# Altium footprint library 2.52-直插元件.PcbLib: 467 footprints (part 28 of 30)
Each footprint in its own frame and in the unit in brackets; x right, y up, seen from the top. Pads: shape width x height; smd on the part's side, far side on the other; paste and mask are expansions set on the pad; w line width, h text height; cw(c..) or ccw(c..) is an arc to the next point about the centre after c.
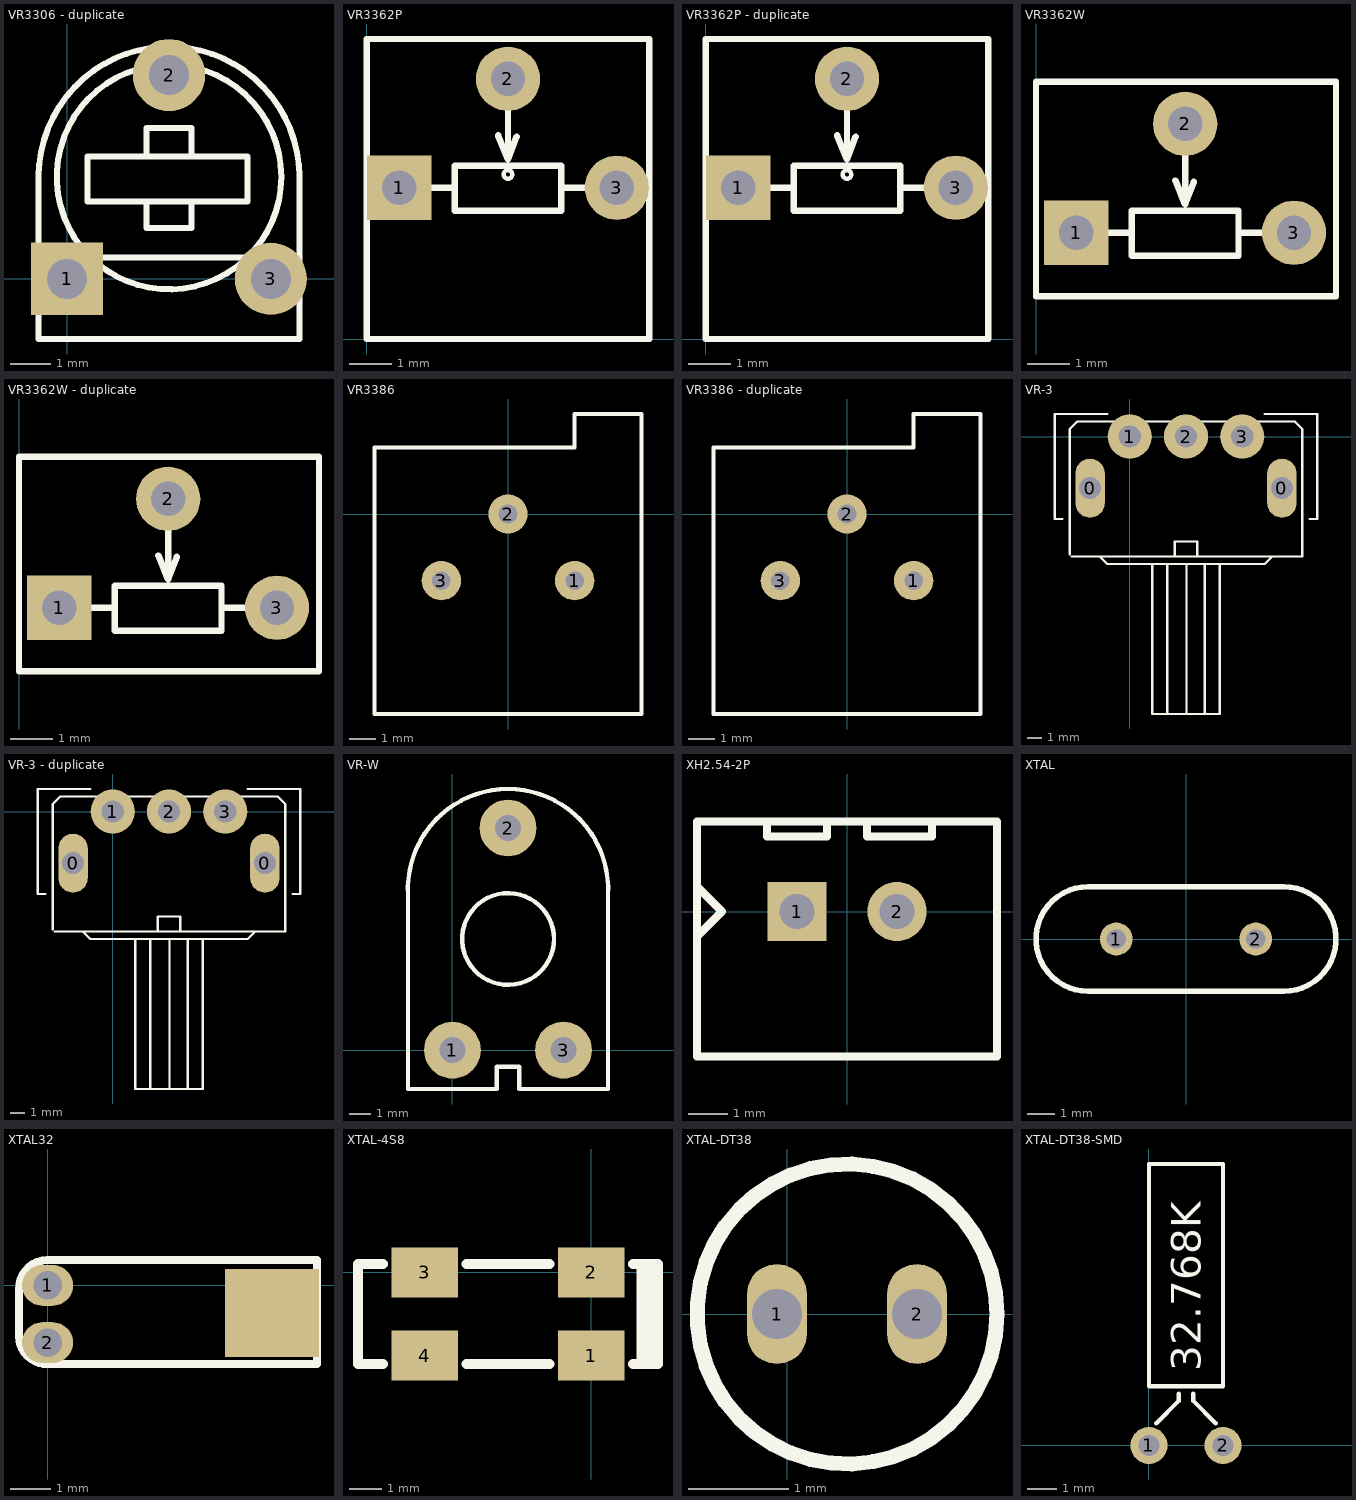
[diagram p27: the footprints below, top view; thin cyan lines are the x and y axes]

## VR3306 - duplicate [mm]
pads (3):
  rect 1.8x1.8 hole 1: 1(0,0)
  round 1.8 hole 1: 2(2.54,5.08) 3(5.08,0)
Top Overlay:
  circle w0.15: c2.54,2.54 r2.801
  lines w0.15: -0.711,-1.5 5.789,-1.5 5.789,2.539 ; -0.71,-1.499 -0.71,2.54 cw(c2.54,2.54) 5.79,2.54 ; 0.61,0.533 4.572,0.533 ; 1.981,1.93 1.981,1.27 3.099,1.27 3.099,1.93 ; 1.981,3.099 1.981,3.759 3.099,3.759 3.099,3.099 ; 0.508,1.93 4.496,1.93 4.496,3.048 0.508,3.048 0.508,1.93
3D body "User Library-Trimmer, 3306F-1.STEP": height 7.62, standoff -3.04, extent -0.865,-2.294 5.945,5.957
3D body "User Library-Trimpot Horizontal.step": height 4.2, standoff -5.6, extent 9.103,14.919 19.103,25.119
3D body "User Library-Trimpot Vertical.step": height 4.2, standoff -1.45, extent 9.327,-1.755 19.327,13.545

## VR3362P [mm]
pads (3):
  rect 1.5x1.5 hole 0.8: 1(0.76,3.53)
  round 1.5 hole 0.8: 2(3.3,6.07) 3(5.84,3.53)
Top Overlay:
  circle w0.1: c3.3,3.84 r0.1
  lines w0.15: 0.76,3.53 2.055,3.53 ; 3.071,4.749 3.3,4.19 ; 3.3,5.892 3.3,4.19 ; 3.503,4.724 3.3,4.19 ; 4.545,3.53 5.84,3.53 ; 2.055,3.53 2.055,4.038 4.545,4.038 4.545,2.997 2.055,2.997 2.055,3.53 ; 0,0 0,7 6.6,7 6.6,0 0,0
3D body "User Library-3362P-1-102LF.step": height 4.4, standoff -3, extent 0,0.2 6.6,6.8

## VR3362P - duplicate [mm] "淘宝ID:黄晶宝石   店铺网址:https://shop463601444.taobao.com"
pads (3):
  rect 1.5x1.5 hole 0.8: 1(0.76,3.53)
  round 1.5 hole 0.8: 2(3.3,6.07) 3(5.84,3.53)
Top Overlay:
  circle w0.1: c3.3,3.84 r0.1
  lines w0.15: 0.76,3.53 2.055,3.53 ; 3.071,4.749 3.3,4.19 ; 3.3,5.892 3.3,4.19 ; 3.503,4.724 3.3,4.19 ; 4.545,3.53 5.84,3.53 ; 2.055,3.53 2.055,2.997 4.545,2.997 4.545,4.038 2.055,4.038 2.055,3.53 ; 0,0 6.6,0 6.6,7 0,7 0,0
3D body "User Library-3362P-1-102LF.step": height 4.4, standoff -3, extent 0,0.2 6.6,6.8

## VR3362W [mm]
pads (3):
  rect 1.5x1.5 hole 0.8: 1(0.94,3.48)
  round 1.5 hole 0.8: 2(3.48,6.02) 3(6.02,3.48)
Top Overlay:
  lines w0.15: 0.94,3.48 2.235,3.48 ; 3.251,4.699 3.48,4.14 ; 3.48,5.842 3.48,4.14 ; 3.683,4.674 3.48,4.14 ; 4.724,3.48 6.02,3.48 ; 2.235,3.48 2.235,2.946 4.724,2.946 4.724,3.988 2.235,3.988 2.235,3.48 ; 0,2 0,7 7,7 7,2 0,2
3D body "User Library-3362W.step": height 6.99, standoff -1.5, extent 0.2,2.365 6.8,7.075

## VR3362W - duplicate [mm]
pads (3):
  rect 1.5x1.5 hole 0.8: 1(0.94,3.48)
  round 1.5 hole 0.8: 2(3.48,6.02) 3(6.02,3.48)
Top Overlay:
  lines w0.15: 0.94,3.48 2.235,3.48 ; 3.251,4.699 3.48,4.14 ; 3.48,5.842 3.48,4.14 ; 3.683,4.674 3.48,4.14 ; 4.724,3.48 6.02,3.48 ; 2.235,3.48 2.235,3.988 4.724,3.988 4.724,2.946 2.235,2.946 2.235,3.48 ; 0,2 7,2 7,7 0,7 0,2
3D body "User Library-3362W.step": height 6.99, standoff -1.5, extent 0.2,2.365 6.8,7.075

## VR3386 [mm]
pads (3):
  round 1.5 hole 0.711: 1(2.54,-2.54) 2(0,0) 3(-2.54,-2.54)
Top Overlay:
  lines w0.15: -5.08,-7.62 -5.08,2.54 2.54,2.54 2.54,3.81 5.08,3.81 5.08,-7.62 -5.08,-7.62
3D body "SW3dPS-3386P-S.STEP": height 5.02, standoff -1.99, extent -4.8,-7.34 4.8,2.26

## VR3386 - duplicate [mm]
pads (3):
  round 1.5 hole 0.711: 1(2.54,-2.54) 2(0,0) 3(-2.54,-2.54)
Top Overlay:
  lines w0.15: -5.08,-7.62 5.08,-7.62 5.08,3.81 2.54,3.81 2.54,2.54 -5.08,2.54 -5.08,-7.62
3D body "SW3dPS-3386P-S.STEP": height 5.02, standoff -1.99, extent -4.8,-7.34 4.8,2.26

## VR-3 [mm]
pads (5):
  oval 2x4 hole 1.5: 0(-2.69,-3.5) 0(10.31,-3.5)
  round 3 hole 1.5: 1(0,0) 2(3.81,0) 3(7.62,0)
Top Overlay:
  lines w0.15: -4.572,-5.588 -5.08,-5.588 -5.08,1.524 -2.54,1.524 ; -4.572,1.524 -1.524,1.524 ; -4.064,-8 -4.064,0.508 -3.556,1.016 11.176,1.016 11.684,0.508 11.684,-8.128 -3.936,-8.128 ; -2.032,-8.128 -1.524,-8.636 9.144,-8.636 9.652,-8.128 ; 1.524,-8.636 1.524,-18.796 6.096,-18.796 6.096,-8.636 ; 2.54,-18.796 2.54,-8.636 ; 3.048,-8.128 3.048,-7.112 4.572,-7.112 4.572,-8.128 ; 3.85,-18.796 3.85,-8.636 ; 5.08,-18.796 5.08,-8.636 ; 9.144,1.524 12.7,1.524 12.7,-5.588 12.192,-5.588
Keep-Out Layer:
  lines w0.15: -2.692,-4.521 -2.692,-2.489 ; 10.308,-4.521 10.308,-2.489
3D body "User Library-Encoder.step": height 30, standoff -5, extent -6.29,-16.653 11.71,4.347

## VR-3 - duplicate [mm] "淘宝ID:黄晶宝石   店铺网址:https://shop463601444.taobao.com"
pads (5):
  oval 2x4 hole 1.5: 0(-2.69,-3.5) 0(10.31,-3.5)
  round 3 hole 1.5: 1(0,0) 2(3.81,0) 3(7.62,0)
Top Overlay:
  lines w0.15: -4.572,-5.588 -5.08,-5.588 -5.08,1.524 -2.54,1.524 ; -4.572,1.524 -1.524,1.524 ; -4.064,-8 -4.064,0.508 -3.556,1.016 11.176,1.016 11.684,0.508 11.684,-8.128 -3.936,-8.128 ; -2.032,-8.128 -1.524,-8.636 9.144,-8.636 9.652,-8.128 ; 1.524,-8.636 1.524,-18.796 6.096,-18.796 6.096,-8.636 ; 2.54,-18.796 2.54,-8.636 ; 3.048,-8.128 3.048,-7.112 4.572,-7.112 4.572,-8.128 ; 3.85,-18.796 3.85,-8.636 ; 5.08,-18.796 5.08,-8.636 ; 9.144,1.524 12.7,1.524 12.7,-5.588 12.192,-5.588
Keep-Out Layer:
  lines w0.15: -2.692,-4.521 -2.692,-2.489 ; 10.308,-4.521 10.308,-2.489
3D body "User Library-Encoder.step": height 30, standoff -5, extent -6.29,-16.653 11.71,4.347

## VR-W [mm]
pads (3):
  round 2.6 hole 1.2: 1(0,0) 2(2.54,10.16) 3(5.08,0)
Top Overlay:
  circle w0.2: c2.543,5.085 r2.1
  lines w0.2: -2.032,-1.778 2.032,-1.778 2.032,-0.762 3.048,-0.762 3.048,-1.778 7.112,-1.778 7.112,7.112 ccw(c2.54,7.366) -2.032,7.112 -2.032,-1.778

## XH2.54-2P [mm] "XH2.54端子直针"
height 1.6
pads (2):
  rect 1.5x1.5 hole 0.9: 1(-1.27,0)
  round 1.5 hole 0.9: 2(1.27,0)
Top Overlay:
  lines w0.2: -3.81,-0.635 -3.175,0 -3.81,0.635 ; -2.032,2.286 -2.032,1.905 -0.508,1.905 -0.508,2.286 ; 0.508,2.286 0.508,1.905 2.159,1.905 2.159,2.286 ; -3.81,-3.683 3.81,-3.683 3.81,2.286 -3.81,2.286 -3.81,-3.683
3D body: height 1.5, standoff 0, extent -3.81,-3.683 3.81,2.159

## XTAL [mm] "Radial Cap, Thru-Hole; 2 Leads; 0.2 in Pin Spacing"
pads (2):
  round 1.2 hole 0.7: 1(-2.54,0) 2(2.54,0)
Top Overlay:
  lines w0.203: -3.556,-1.905 cw(c-3.556,0) -3.556,1.905 3.556,1.905 cw(c3.556,0) 3.556,-1.905 -3.556,-1.905
3D body "XTAL.STEP": height 3.22, standoff -2.41, extent -5.334,-2.054 5.334,2.054

## XTAL32 [mil]
pads (3):
  oval 50x40 hole 28: 1(0,0) 2(0,-56)
  rect 92.13x86 smd: ""(220,-27)
Top Overlay:
  lines w8: -28,-50 ccw(c-0.5,-49.5) 0,-77 264,-77 264,25 0,25 ccw(c0.5,-3.5) -28,-4 -28,-50

## XTAL-4S8 [mil]
pads (4):
  rect 80x60 smd: 1(0,-100) 2(0,0) 3(-200,0) 4(-200,-100)
Top Overlay:
  lines w12: -250,-110 -280,-110 -280,10 -250,10 ; -150,-110 -50,-110 ; -150,10 -50,10 ; 50,-110 80,-110 80,10 50,10 ; 60,-110 60,10 ; 70,-110 70,10

## XTAL-DT38 [mm] "淘宝ID:黄晶宝石   店铺网址:https://shop463601444.taobao.com"
pads (2):
  oval 0.6x1 hole 0.5: 1(-0.1,0) 2(1.3,0)
Top Overlay:
  circle w0.15: c0.6,0 r1.5
3D body "User Library-TC38.step": height 6.5, standoff -1.8, extent -0.55,-1 1.75,1

## XTAL-DT38-SMD [mil]
pads (2):
  round 50 hole 28: 1(0,0) 2(100,0)
Top Overlay:
  lines w5.91: 10,30 40,60 40,70 ; 60,70 60,60 90,30 ; 0,80 0,380 100,380 100,80 0,80
  text "32.768K" at 70,100 h40
3D body "User Library-TC38 SMD.step": height 78.74, standoff -9.84, extent -4.92,-1.18 104.92,372.83